# Altium footprint library RGBandGestureSensors.PcbLib: 43 footprints (part 2 of 3)
Each footprint in its own frame and in the unit in brackets; x right, y up, seen from the top. Pads: shape width x height; smd on the part's side, far side on the other; paste and mask are expansions set on the pad; w line width, h text height; cw(c..) or ccw(c..) is an arc to the next point about the centre after c.
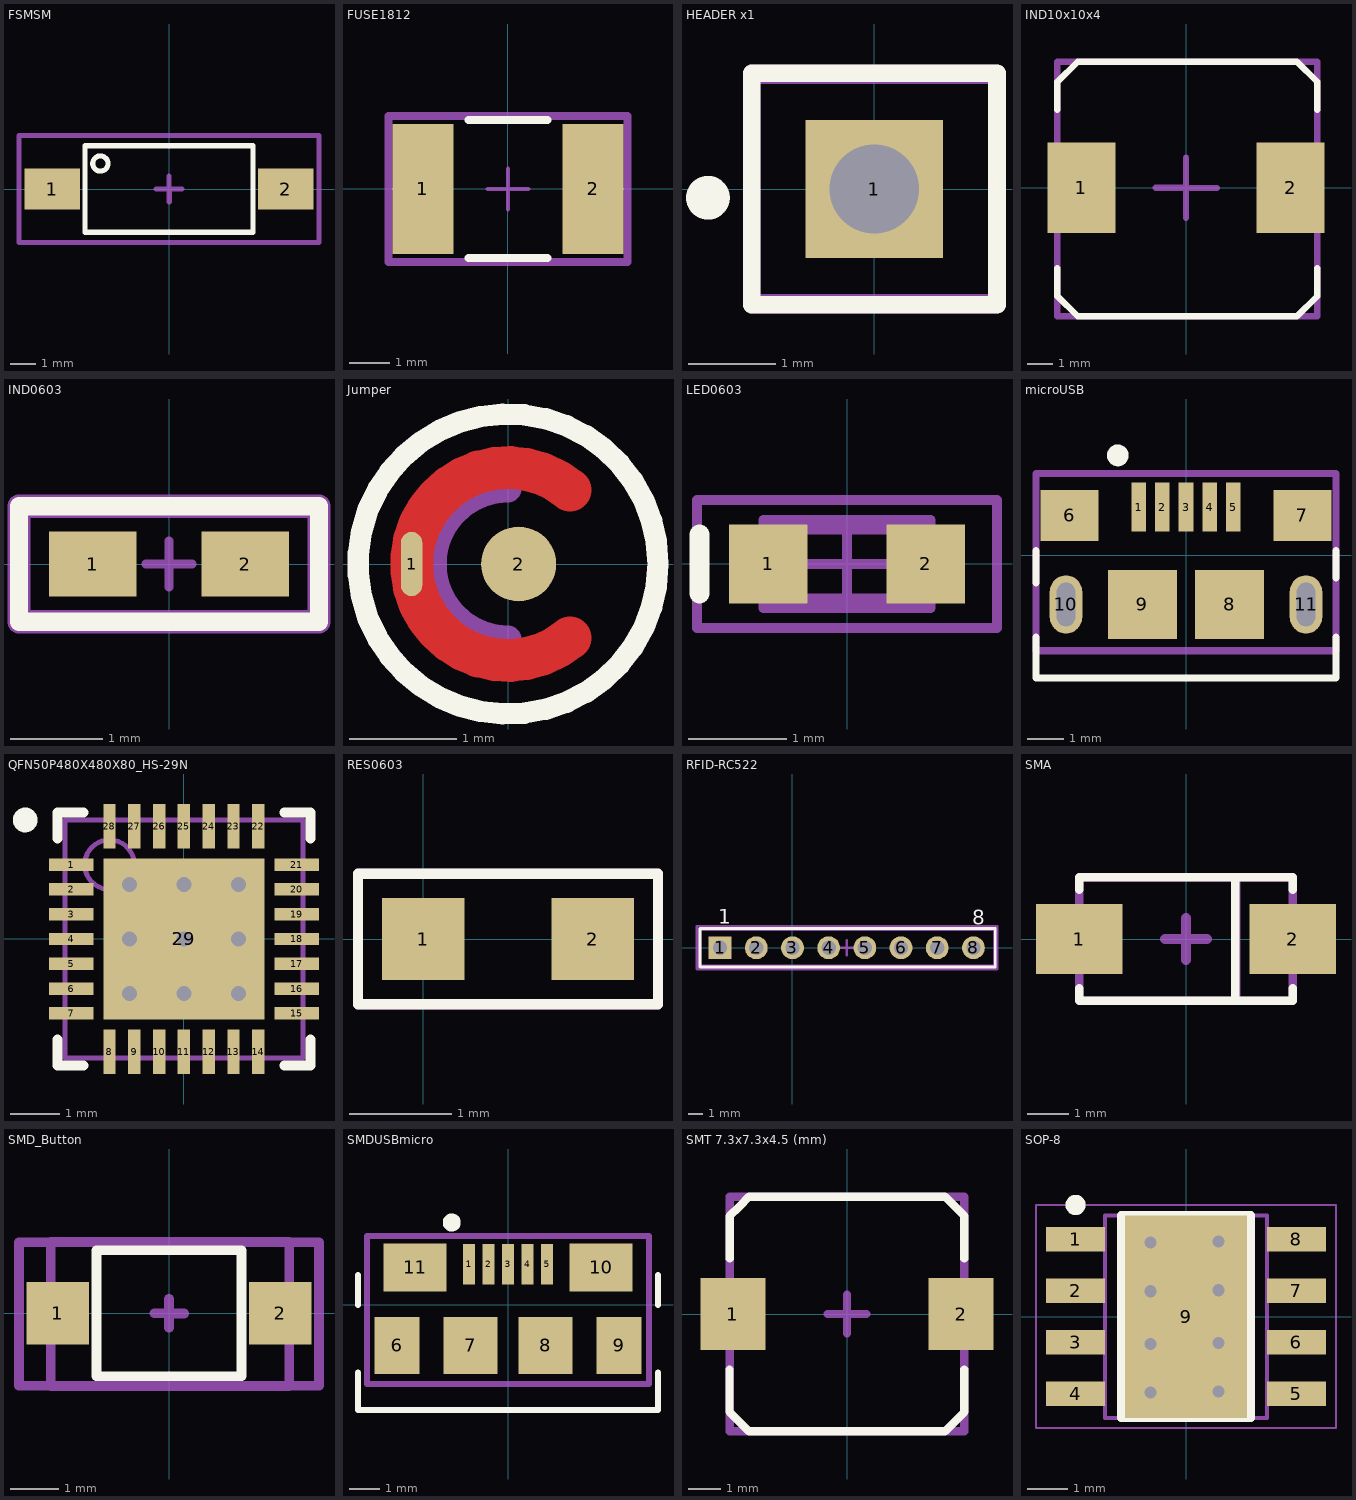
[diagram p1: the footprints below, top view; thin cyan lines are the x and y axes]

## FSMSM [mm]
pads (2):
  rect 2.18x1.6 smd: 1(-4.59,0) 2(4.59,0)
Top Overlay:
  circle w0.2: c-2.7,1 r0.3
  lines w0.2: -3.3,-1.7 -3.3,1.7 3.3,1.7 3.3,-1.7 -3.3,-1.7
Top Assembly:
  lines w0.2: -5.9,-2.1 -5.9,2.1 5.9,2.1 5.9,-2.1 -5.9,-2.1
Mechanical 15:
  lines w0.2: -0.5,0 0,0 0,0.5 ; 0.01,-0.5 0.01,0 ; 0.01,-0.004 0.51,-0.004 ; -5.9,-2.1 5.9,-2.1 5.9,2.1 -5.9,2.1 -5.9,-2.1
3D body "92f2863_fsmsm.stp": height 4.4, standoff -0.02, extent -4.985,-1.75 4.984,1.75

## FUSE1812 [mm]
pads (2):
  rect 1.5x3.2 smd paste+0 mask+0: 1(-2.1,0) 2(2.1,0)
Top Overlay:
  lines w0.2: -0.975,-1.705 0.975,-1.705 ; -0.975,1.705 0.975,1.705
Top Assembly:
  lines w0.2: -2.95,-1.805 2.95,-1.805 2.95,1.805 -2.95,1.805 -2.95,-1.805
Mechanical 15:
  lines w0.1: -0.5,0 0.5,0 ; 0,-0.5 0,0.5
  lines w0.2: -2.95,-1.805 -2.95,1.805 2.95,1.805 2.95,-1.805 -2.95,-1.805
3D body "Fuse_Bourns_MF-MSMF050-2_eec.STEP": height 0.85, standoff 0, extent -2.275,-1.62 2.275,1.62

## HEADER x1 [mm]
pads (1):
  rect 1.57x1.57 hole 1.02 paste-1000 mask+0: 1(0,0)
Top Overlay:
  circle w0.25: c-1.9,-0.1 r0.125
  lines w0.2: -1.4,-1.32 1.4,-1.32 1.4,1.32 -1.4,1.32 -1.4,-1.32
Top Assembly:
  lines w0.2: -1.4,-1.32 -1.4,1.32 1.4,1.32 1.4,-1.32 -1.4,-1.32
Mechanical 13:
  lines w0.1: -0.5,0 0.5,0 ; 0,-0.5 0,0.5
Mechanical 15:
  lines w0.2: -1.4,-1.3 1.4,-1.3 1.4,1.3 -1.4,1.3 -1.4,-1.3

## IND10x10x4 [mm]
pads (2):
  rect 2.7x3.6 smd: 1(-4.15,0) 2(4.15,0)
Top Overlay:
  lines w0.254: -5.1,-3.2 -5.1,-4.3 -4.3,-5.1 -2.7,-5.1 2.8,-5.1 4.4,-5.1 5.2,-4.3 5.2,-3.2 ; -5.1,3.1 -5.1,4.2 -4.3,5 -2.7,5 2.8,5 4.4,5 5.2,4.2 5.2,3.1
Top Assembly:
  lines w0.254: -5.1,-5.1 -5.1,5 5.2,5 5.2,-5.1 -5.1,-5.1
Mechanical 15:
  lines w0.254: -1.194,-0.003 0.006,-0.003 ; 0,-1.2 0,0 0,1.2 ; 0.014,-0.012 1.214,-0.012 ; -5.1,-5.1 -5.1,5 5.2,5 5.2,-5.1 -5.1,-5.1
3D body "SRR1050A.stp": height 4.8, standoff 0, extent -5.055,-5.004 5.155,5.004

## IND0603 [mm]
pads (2):
  rect 0.95x0.7 smd: 1(-0.825,0) 2(0.825,0)
Top Overlay:
  lines w0.2: -1.625,-0.625 1.625,-0.625 1.625,0.625 -1.625,0.625 -1.625,-0.625
Top Assembly:
  lines w0.254: -1.625,-0.625 1.625,-0.625 1.625,0.625 -1.625,0.625 -1.625,-0.625
Mechanical 15:
  lines w0.1: -0.25,0 0.25,0 ; 0,-0.25 0,0.25
  lines w0.2: -1.625,-0.625 -1.625,0.625 1.625,0.625 1.625,-0.625 -1.625,-0.625
3D body "User Library-CR1608-0603.STEP": height 0.45, standoff 0, extent -0.8,-0.4 0.8,0.4

## Jumper [mm]
pads (2):
  oval 0.2x0.6 smd: 1(-0.9,0)
  round 0.7 smd paste-0.05: 2(0.1,0)
Top Layer:
  lines w0.4: 0.579,-0.689 cw(c0,0) 0.579,0.689
Top Overlay:
  circle w0.2: c0,0 r1.4
Mechanical 6:
  lines w0.254: 0,-0.7 cw(c0,0) 0,0.7

## LED0603 [mm]
pads (2):
  rect 0.8x0.8 smd: 1(-0.8,0) 2(0.8,0)
Top Overlay:
  lines w0.2: -1.5,-0.3 -1.5,0.3
Top Assembly:
  lines w0.1: -0.85,-0.45 -0.85,0.45 0.85,0.45 0.85,-0.45 -0.85,-0.45
3D:
  lines w0.2: -0.8,-0.4 -0.8,0.4 0.8,0.4 0.8,-0.4 -0.8,-0.4
Mechanical 15:
  lines w0.1: -0.45,0 0.45,0 ; 0,-0.45 0,0.45 ; -1.525,-0.65 -1.525,0.65 1.525,0.65 1.525,-0.65 -1.525,-0.65
3D body "WL-SMCW_0603_LED.stp": height 0.7, standoff 0, extent -0.8,-0.4 0.8,0.4

## microUSB [mm]
pads (11):
  rect 0.4x1.35 smd: 1(-1.3,1.325) 2(-0.65,1.325) 3(0,1.325) 4(0.65,1.325) 5(1.3,1.325)
  rect 1.6x1.4 smd: 6(-3.2,1.1) 7(3.2,1.1)
  rect 1.9x1.9 smd: 8(1.2,-1.35) 9(-1.2,-1.35)
  oval 0.9x1.6 hole 1.2 slot 0.5 at 0 deg: 10(-3.3,-1.35) 11(3.3,-1.35)
Top Overlay:
  circle w0.3: c-1.875,2.75 r0.15
  lines w0.2: -4.125,-2.25 -4.125,-3.375 4.125,-3.375 4.125,-2.25 ; -4.125,-0.75 -4.125,0.125 ; 4.125,-0.625 4.125,0.125
Top Assembly:
  lines w0.2: -4.125,-2.625 -4.125,2.25 4.125,2.25 4.125,-2.625 -4.125,-2.625
3D body "10118193-0001lfc.stp": height 2.83, standoff -0.77, extent -3.93,-4.113 3.927,1.548

## QFN50P480X480X80_HS-29N [mm] "QFN, 28-Leads, Body 4,80x4,80mm, Pitch 0,50mm, Thermal Pad 3,25x3,25mm, IPC Medium Density"
height 0.8
pads (29):
  rect 0.9x0.25 smd: 1(-2.275,1.5) 2(-2.275,1) 3(-2.275,0.5) 4(-2.275,0) 5(-2.275,-0.5) 6(-2.275,-1) 7(-2.275,-1.5) 15(2.275,-1.5) 16(2.275,-1) 17(2.275,-0.5) 18(2.275,0) 19(2.275,0.5) 20(2.275,1) 21(2.275,1.5)
  rect 0.25x0.9 smd: 8(-1.5,-2.275) 9(-1,-2.275) 10(-0.5,-2.275) 11(0,-2.275) 12(0.5,-2.275) 13(1,-2.275) 14(1.5,-2.275) 22(1.5,2.275) 23(1,2.275) 24(0.5,2.275) 25(0,2.275) 26(-0.5,2.275) 27(-1,2.275) 28(-1.5,2.275)
  rect 3.25x3.25 smd: 29(0,0)
via 0,0 diameter 0.6 hole 0.3
via -1.1,1.1 diameter 0.6 hole 0.3
via 0,1.1 diameter 0.6 hole 0.3
via 1.1,1.1 diameter 0.6 hole 0.3
via -1.1,0 diameter 0.6 hole 0.3
via 1.1,0 diameter 0.6 hole 0.3
via -1.1,-1.1 diameter 0.6 hole 0.3
via 0,-1.1 diameter 0.6 hole 0.3
via 1.1,-1.1 diameter 0.6 hole 0.3
Top Overlay:
  circle w0.25: c-3.2,2.4 r0.125
  lines w0.2: -2.55,-2.025 -2.55,-2.55 -2.025,-2.55 ; -2.55,2.025 -2.55,2.55 -2.025,2.55 ; 2.025,-2.55 2.55,-2.55 2.55,-2.025 ; 2.025,2.55 2.55,2.55 2.55,2.025
Top Assembly:
  circle w0.1: c-1.5,1.5 r0.5
  lines w0.1: -2.4,-2.4 -2.4,2.4 2.4,2.4 2.4,-2.4 -2.4,-2.4
Mechanical 15:
  lines w0.1: -0.5,0 0.5,0 ; 0,-0.5 0,0.5
3D body "QFN50P480X480X80_HS-29N.step": height 0.8, standoff 0, extent -2.41,-2.41 2.41,2.41

## RES0603 [mm]
pads (2):
  rect 0.8x0.8 smd: 1(0,0) 2(1.65,0)
Top Overlay:
  lines w0.1: -0.635,-0.635 -0.635,0.635 2.286,0.635 2.286,-0.635 -0.635,-0.635
Top Assembly:
  lines w0.1: -0.635,-0.635 -0.635,0.635 2.286,0.635 2.286,-0.635 -0.635,-0.635
3D body "CircuitWorks-RESISTOR 0603.STEP": height 0.48, standoff -0.03, extent -0.038,-0.43 1.562,0.43

## RFID-RC522 [mm]
pads (8):
  rect 1.6x1.6 hole 1: 1(-5.08,0)
  round 1.6 hole 1: 2(-2.54,0) 3(0,0) 4(2.54,0) 5(5.08,0) 6(7.62,0) 7(10.16,0) 8(12.7,0)
Top Overlay:
  lines w0.2: 3.83,-1.345 -6.5,-1.345 -6.5,1.345 3.83,1.345 ; 3.9,-1.345 14.23,-1.345 14.23,1.345 3.9,1.345
  text "1" at -5.2,1.7 h1.02
  text "8" at 12.605,1.625 h1.02
Top Assembly:
  lines w0.254: -6.5,-1.3 14.2,-1.3 14.2,1.3 -6.5,1.3 -6.5,-1.3
Mechanical 15:
  lines w0.2: 3.305,0 4.305,0 ; 3.7,-1.485 14.355,-1.485 14.355,1.507 3.7,1.507 ; 3.805,-0.5 3.805,0.5 ; 3.955,-1.485 -6.7,-1.485 -6.7,1.507 3.955,1.507
3D body "User Library-RFID.STEP": height 10.8, standoff -0.74, extent -16.6,-2.2 23.4,57.8

## SMA [mm]
pads (2):
  rect 2.1x1.7 smd paste+0 mask+0: 1(-2.6,0) 2(2.6,0)
Top Overlay:
  lines w0.2: -2.6,-1.2 -2.6,-1.5 -1.2,-1.5 0.5,-1.5 2.6,-1.5 2.6,-1.2 ; -2.6,1.2 -2.6,1.5 -0.5,1.5 1.2,1.5 ; 1.2,-1.5 1.2,1.5 ; 2.6,1.2 2.6,1.5 1.2,1.5
Top Assembly:
  lines w0.2: 1.225,-1.5 1.225,1.5 ; -2.6,-1.5 -2.6,1.5 2.6,1.5 2.6,-1.5 -2.6,-1.5
Mechanical 13:
  lines w0.2: -2.6,-1.5 2.6,-1.5 2.6,1.5 -2.6,1.5 -2.6,-1.5
Mechanical 15:
  lines w0.2: -2.6,-1.5 2.6,-1.5 2.6,1.5 -2.6,1.5 -2.6,-1.5
  lines w0.254: -0.5,0 0.5,0 ; 0,-0.5 0,0.5
Mechanical 16:
  lines w0.1: -0.5,0 0.5,0 ; 0,-0.5 0,0.5
3D body "User Library-DO-214AC SMA.STEP": height 2.4, standoff 0, extent -2.6,-1.3 2.6,1.3

## SMD_Button [mm]
pads (2):
  rect 1.3x1.3 smd: 1(-2.3,0) 2(2.3,0)
Top Overlay:
  lines w0.2: -1.5,-1.3 -1.5,1.3 1.5,1.3 1.5,-1.3 -1.5,-1.3
Top Assembly:
  lines w0.2: -2.444,-1.504 -2.444,1.471 2.484,1.471 2.484,-1.504 -2.444,-1.504
Mechanical 15:
  lines w0.2: -0.3,0 0,0 ; 0,-0.3 0,0 ; 0,0.3 0,0 ; 0.018,-0.006 0.318,-0.006 ; -3.1,-1.5 3.1,-1.5 3.1,1.468 -3.1,1.468 -3.1,-1.5
3D body "User Library-Pushbutton3x4x2.STEP": height 2, standoff 0, extent -2.45,-1.45 2.45,1.45

## SMDUSBmicro [mm]
pads (11):
  rect 0.4x1.35 smd: 1(-1.3,1.35) 2(-0.65,1.35) 3(0,1.35) 4(0.65,1.35) 5(1.3,1.35)
  rect 1.5x1.9 smd: 6(-3.7,-1.35) 9(3.7,-1.35)
  rect 1.8x1.9 smd: 7(-1.25,-1.35) 8(1.25,-1.35)
  rect 2.1x1.6 smd: 10(3.1,1.25) 11(-3.1,1.25)
Top Overlay:
  circle w0.3: c-1.875,2.75 r0.15
  lines w0.2: -5,-2.25 -5,-3.5 5,-3.5 5,-2.25 ; -5,0 -5,1 ; 5,0 5,1
Top Assembly:
  lines w0.2: -4.7,-2.625 -4.7,2.3 4.7,2.3 4.7,-2.625 -4.7,-2.625
3D body "User Library-3067-47340001R-Rev_01.STEP": height 2.72, standoff -0.22, extent -4.125,-3.88 4.075,2.05

## SMT 7.3x7.3x4.5 (mm) [mm]
pads (2):
  rect 2x2.2 smd: 1(-3.5,0) 2(3.5,0)
Top Overlay:
  lines w0.254: -3.6,-1.7 -3.6,-3 -3,-3.6 0,-3.6 3,-3.6 3.6,-3 3.6,-1.7 ; -3.6,1.7 -3.6,3 -3.3,3.3 -3,3.6 0,3.6 3,3.6 3.6,3 3.6,1.7
Mechanical 13:
  lines w0.254: -3.6,-3.6 0,-3.6 3.6,-3.6 3.6,0 3.6,3.6 0,3.6 -3.6,3.6 -3.6,0 -3.6,-3.6
Mechanical 15:
  lines w0.254: -0.6,0 0.6,0 ; 0,-0.6 0,0.6 ; -3.6,-3.6 0,-3.6 3.6,-3.6 3.6,0 3.6,3.6 0,3.6 -3.6,3.6 -3.6,0 -3.6,-3.6
3D body "B82472G6223M000.stp": height 4.5, standoff 0, extent -3.65,-3.65 3.65,3.65

## SOP-8 [mm] "TSOP, 8-Leads, Body 4,90x3,90mm, Pitch 1,27mm, Thermal Pad 4,00x2,00mm, IPC Medium Density"
height 1.35
pads (9):
  rect 1.45x0.6 smd: 1(-2.725,1.905) 2(-2.725,0.635) 3(-2.725,-0.635) 4(-2.725,-1.905) 5(2.725,-1.905) 6(2.725,-0.635) 7(2.725,0.635) 8(2.725,1.905)
  rect 3x5 smd: 9(0,0)
via 0.8,0.65 diameter 0.6 hole 0.3
via 0.8,1.85 diameter 0.6 hole 0.3
via 0.8,-1.85 diameter 0.6 hole 0.3
via 0.8,-0.65 diameter 0.6 hole 0.3
via -0.875,-1.875 diameter 0.6 hole 0.3
via -0.875,-0.675 diameter 0.6 hole 0.3
via -0.875,0.625 diameter 0.6 hole 0.3
via -0.875,1.825 diameter 0.6 hole 0.3
Top Overlay:
  circle w0.25: c-2.725,2.755 r0.125
  lines w0.2: -1.6,-2.5 1.6,-2.5 1.6,2.5 -1.6,2.5 -1.6,-2.5
Top Assembly:
  circle w0.1: c-1.1,1.6 r0.5
  lines w0.1: -2,-2.5 2,-2.5 2,2.5 -2,2.5 -2,-2.5
Mechanical 15:
  lines w0.05: -3.7,-2.75 3.7,-2.75 3.7,2.75 -3.7,2.75 -3.7,-2.75
  lines w0.1: -0.5,0 0.5,0 ; 0,-0.5 0,0.5
3D body "TSOP127P600X135_HS-9N.step": height 1.35, standoff 0, extent -3,-2.5 3,2.5